# Altium footprint library Mine.PcbLib: 306 footprints (part 7 of 20)
Each footprint in its own frame and in the unit in brackets; x right, y up, seen from the top. Pads: shape width x height; smd on the part's side, far side on the other; paste and mask are expansions set on the pad; w line width, h text height; cw(c..) or ccw(c..) is an arc to the next point about the centre after c.
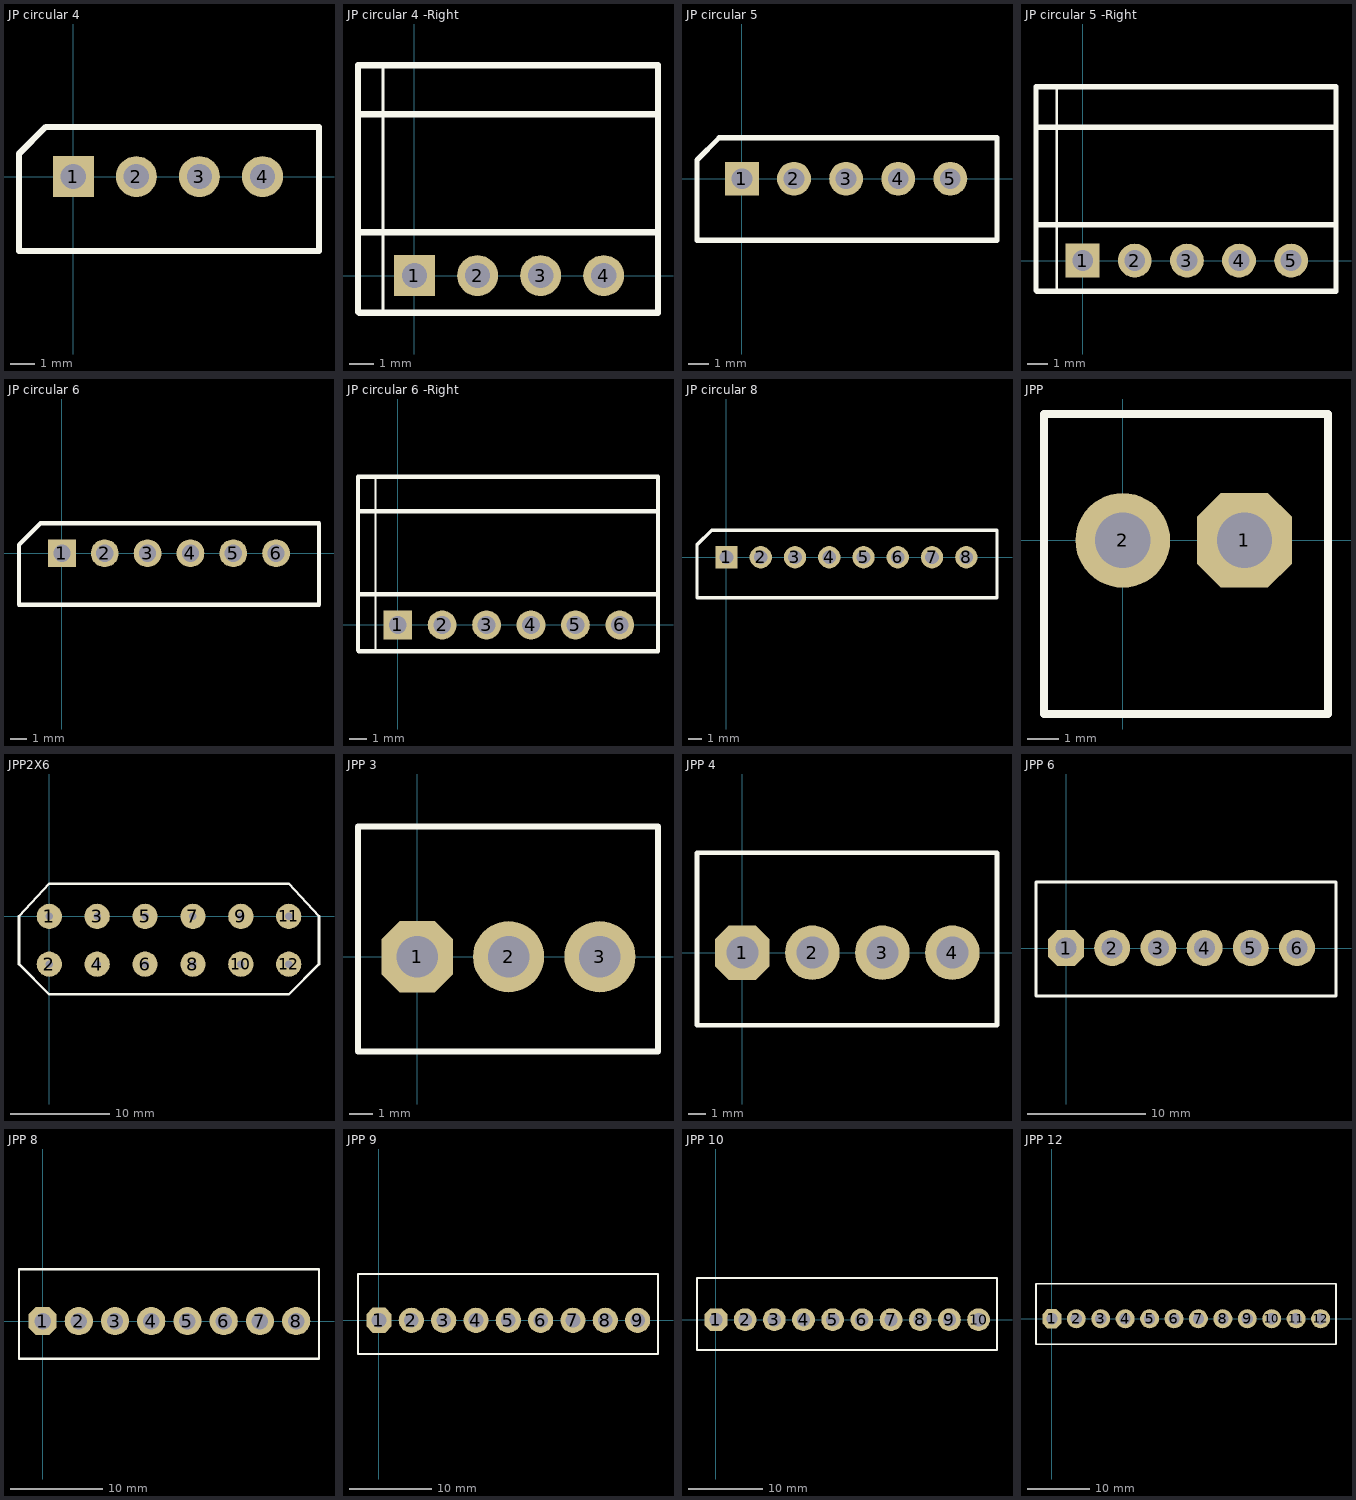
[diagram p6: the footprints below, top view; thin cyan lines are the x and y axes]

## JP circular 4 [mil]
height 236.22
pads (4):
  rect 65x65 hole 40: 1(0,0)
  round 65 hole 40: 2(100,0) 3(200,0) 4(300,0)
Top Overlay:
  lines w10: -86.02,-118.11 -86.02,36.02 -43.31,78.74 389.57,78.74 389.57,-118.11 -86.02,-118.11

## JP circular 4 -Right [mil]
height 196.85
pads (4):
  rect 65x65 hole 40: 1(0,0)
  round 65 hole 40: 2(100,0) 3(200,0) 4(300,0)
Top Overlay:
  lines w5: -50,-59.06 -50,333.66
  lines w10: -89.57,68.9 386.02,68.9 ; -89.57,231.3 -89.57,331.69 ; -89.57,333.66 386.02,333.66 ; 386.02,-59.06 -87.6,-59.06 -89.57,-57.09 -89.57,255.91 386.02,255.91 386.02,-58.07 ; 386.02,242.13 386.02,331.69

## JP circular 5 [mil]
height 236.22
pads (5):
  rect 65x65 hole 40: 1(0,0)
  round 65 hole 40: 2(100,0) 3(200,0) 4(300,0) 5(400,0)
Top Overlay:
  lines w10: -86.02,-118.11 489.57,-118.11 489.57,78.74 -43.31,78.74 -86.02,36.02 -86.02,-118.11

## JP circular 5 -Right [mil]
height 196.85
pads (5):
  rect 65x65 hole 40: 1(0,0)
  round 65 hole 40: 2(100,0) 3(200,0) 4(300,0) 5(400,0)
Top Overlay:
  lines w5: -50,-59.06 -50,333.66
  lines w10: -89.57,68.9 486.02,68.9 ; -89.57,231.3 -89.57,331.69 ; -89.57,333.66 486.02,333.66 ; 486.02,242.13 486.02,331.69 ; -89.57,-57.09 -89.57,255.91 486.02,255.91 486.02,-59.06 -87.6,-59.06 -89.57,-57.09

## JP circular 6 [mil]
height 236.22
pads (6):
  rect 65x65 hole 40: 1(0,0)
  round 65 hole 40: 2(100,0) 3(200,0) 4(300,0) 5(400,0) 6(500,0)
Top Overlay:
  lines w10: 600,-120 -100,-120 -100,20 -50,70 600,70 600,-118.11

## JP circular 6 -Right [mil]
height 196.85
pads (6):
  rect 65x65 hole 40: 1(0,0)
  round 65 hole 40: 2(100,0) 3(200,0) 4(300,0) 5(400,0) 6(500,0)
Top Overlay:
  lines w5: -50,-59.06 -50,333.66
  lines w10: -89.57,68.9 586.02,68.9 ; -89.57,231.3 -89.57,331.69 ; -89.57,333.66 586.02,333.66 586.02,242.13 ; -89.57,-57.09 -89.57,255.91 586.02,255.91 586.02,-59.06 -87.6,-59.06 -89.57,-57.09

## JP circular 8 [mil]
height 236.22
pads (8):
  rect 65x65 hole 40: 1(0,0)
  round 65 hole 40: 2(100,0) 3(200,0) 4(300,0) 5(400,0) 6(500,0) 7(600,0) 8(700,0)
Top Overlay:
  lines w10: -86.02,-118.11 789.57,-118.11 789.57,78.74 -43.31,78.74 -86.02,36.02 -86.02,-118.11

## JPP [mil]
height 590.55
pads (2):
  oct 120x120 hole 70: 1(154,0)
  round 120 hole 70: 2(0,0)
Top Overlay:
  lines w10: -100,-220 260,-220 260,160 -100,160 -100,-220

## JPP2X6 [mil]
pads (12):
  round 100 hole 30: 1(0,0) 2(0,-190) 3(190,0) 4(190,-190) 5(380,0) 6(380,-190) 7(570,0) 8(570,-190) 9(760,0) 10(760,-190) 11(950,0) 12(950,-190)
Top Overlay:
  lines w10: -120,-190 -120,0 0,130 950,130 1070,0 1070,-190 950,-310 0,-310 -120,-190

## JPP 3 [mil]
height 393.7
pads (3):
  oct 120x120 hole 70: 1(0,0)
  round 120 hole 70: 2(154,0) 3(308,0)
Top Overlay:
  lines w10: 405,-160 -100,-160 -100,220 405,220 ; 406,-160 406,220

## JPP 4 [mil]
height 393.7
pads (4):
  oct 120x120 hole 70: 1(0,0)
  round 120 hole 70: 2(154,0) 3(308,0) 4(462,0)
Top Overlay:
  lines w10: -100,-160 560,-160 560,220 -100,220 -100,-160

## JPP 6 [mil]
height 393.7
pads (6):
  oct 120x120 hole 70: 1(0,0)
  round 120 hole 70: 2(154,0) 3(308,0) 4(462,0) 5(616,0) 6(770,0)
Top Overlay:
  lines w10: -100,-160 900,-160 900,220 -100,220 -100,-160

## JPP 8 [mil]
height 393.7
pads (8):
  oct 120x120 hole 70: 1(0,0)
  round 120 hole 70: 2(154,0) 3(308,0) 4(462,0) 5(616,0) 6(770,0) 7(924,0) 8(1078,0)
Top Overlay:
  lines w10: -100,-160 -100,220 1175,220 1175,-160 -100,-160

## JPP 9 [mil]
height 393.7
pads (9):
  oct 120x120 hole 70: 1(0,0)
  round 120 hole 70: 2(154,0) 3(308,0) 4(462,0) 5(616,0) 6(770,0) 7(924,0) 8(1078,0) 9(1232,0)
Top Overlay:
  lines w10: -100,-160 -100,220 1329,220 1329,-160 -100,-160

## JPP 10 [mil]
height 393.7
pads (10):
  oct 120x120 hole 70: 1(0,0)
  round 120 hole 70: 2(154,0) 3(308,0) 4(462,0) 5(616,0) 6(770,0) 7(924,0) 8(1078,0) 9(1232,0) 10(1386,0)
Top Overlay:
  lines w10: -100,-160 -100,220 1483,220 1483,-160 -100,-160

## JPP 12 [mil]
height 393.7
pads (12):
  oct 120x120 hole 70: 1(0,0)
  round 120 hole 70: 2(154,0) 3(308,0) 4(462,0) 5(616,0) 6(770,0) 7(924,0) 8(1078,0) 9(1232,0) 10(1386,0) 11(1540,0) 12(1694.02,0)
Top Overlay:
  lines w10: -100,-160 -100,220 1791.34,220 1791.34,-160 -100,-160